# Altium footprint library EPCOS.PcbLib: 178 footprints (part 11 of 12)
Each footprint in its own frame and in the unit in brackets; x right, y up, seen from the top. Pads: shape width x height; smd on the part's side, far side on the other; paste and mask are expansions set on the pad; w line width, h text height; cw(c..) or ccw(c..) is an arc to the next point about the centre after c.
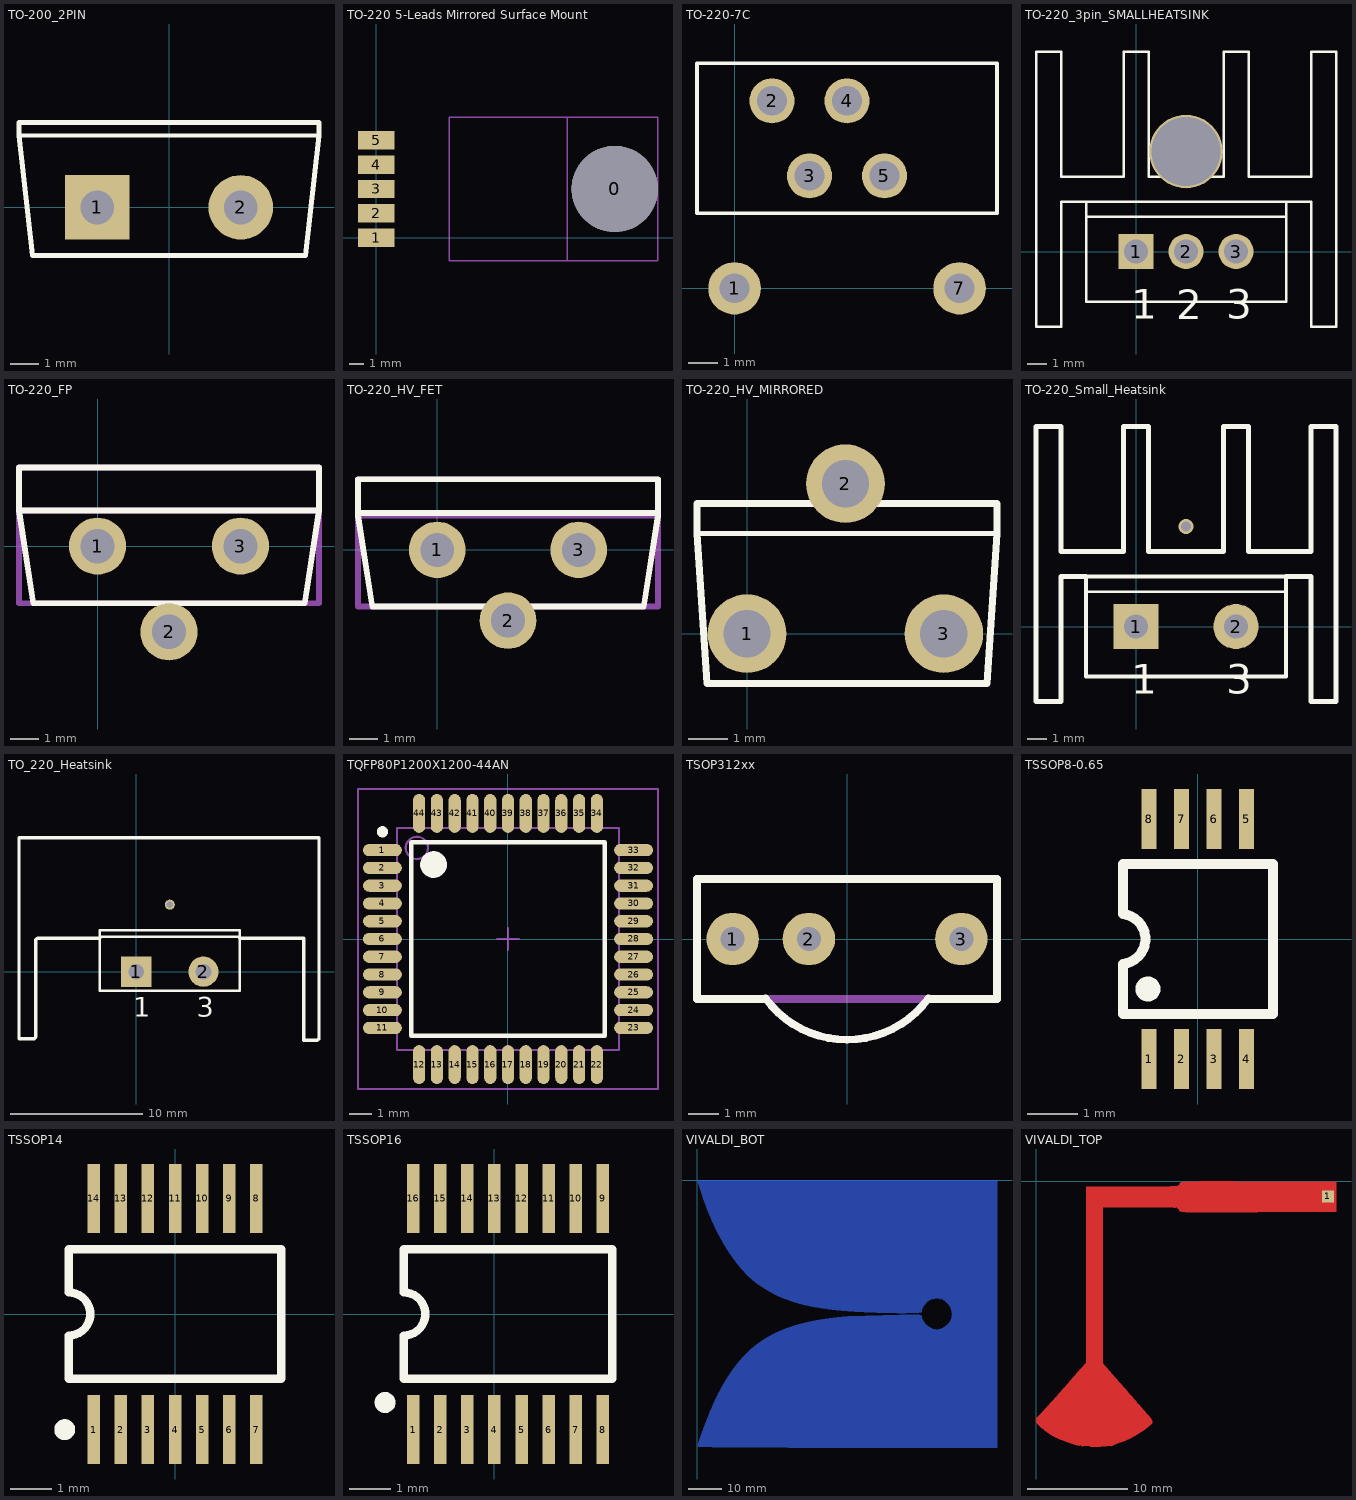
[diagram p10: the footprints below, top view; thin cyan lines are the x and y axes]

## TO-200_2PIN [mil]
height 790
pads (2):
  rect 90x90 hole 47.24: 1(-100,0)
  round 90 hole 47.24: 2(100,0)
Top Overlay:
  lines w5: -209.02,100 208.98,100
  lines w7: -209.02,100 -209.02,118 209.02,118 209.02,100 190,-67 -190,-67 -209.02,100
3D body "User Library-TO220-2_V-S.STEP": height 787.4, standoff -86.61, extent -196.85,-71.47 196.85,105.7

## TO-220 5-Leads Mirrored Surface Mount [mil]
height 181
pads (6):
  round 236 hole 236.22 unplated: 0(653,133.33)
  rect 100x50 smd: 1(0,0) 2(0,66.67) 3(0,133.33) 4(0,200) 5(0,266.67)
Mechanical 13:
  lines w4: 523,-63.7 771,-63.7 771,330.3 523,330.3 ; 523,-63.7 200,-63.7 200,330.3 523,330.3 ; 523,-63.7 523,330.3
3D body: height 181, standoff 130, extent 523.02,-63.68 770.98,330.28
3D body: height 181, standoff 0, extent 200.02,-63.68 522.98,330.28

## TO-220-7C [mil]
height 787
pads (6):
  round 70 hole 39.37: 1(0,0) 7(300,0)
  round 60 hole 39.37: 2(50,250) 3(100,150) 4(150,250) 5(200,150)
Top Overlay:
  lines w5: -50,100 350,100 350,300 -50,300 -50,100

## TO-220_3pin_SMALLHEATSINK [mil]
height 980
pads (4):
  rect 70x70 hole 47.24: 1(0,0)
  round 70 hole 47.24: 2(100,0) 3(200,0)
  round 147 hole 137.8: ""(100,200)
Top Overlay:
  lines w5: -100,70 300,70 ; -100,100 -150,100 -150,-150 -200,-150 -200,400 -150,400 -150,150 -25,150 -25,400 25,400 25,150 175,150 175,400 225,400 225,150 350,150 350,400 400,400 400,-150 350,-150 350,100 300,100 ; -100,100 300,100 ; -100,100 -100,-100 300,-100 300,100
  text "1" at -9.84,-134.84 h59.06
  text "3" at 180.31,-134.84 h59.06
  text "2" at 80,-135 h59.06
3D body: height 980, standoff 0, extent -199.98,-149.98 399.98,399.98

## TO-220_FP [mm]
height 20
pads (3):
  round 2 hole 1.2: 1(0,0) 2(2.5,-3) 3(5,0)
Top Overlay:
  lines w0.2: -2.75,1.25 -2.25,-2 7.25,-2 7.75,1.25 ; -2.75,1.25 -2.75,2.75 7.75,2.75 7.75,1.25 ; -2.75,1.25 7.75,1.25
Mechanical 13:
  lines w0.2: -2.75,1.2 -2.75,2.75 7.75,2.75 7.75,1.2 ; -2.75,-2 -2.75,1.25 7.75,1.25 7.75,-2 -2.75,-2
3D body: height 13.5, standoff 5, extent -2.75,-2 7.75,1.25
3D body: height 20, standoff 5, extent -2.75,1.25 7.75,2.75

## TO-220_HV_FET [mm]
height 20.066
pads (3):
  round 2 hole 1.2: 1(0,0) 2(2.5,-2.5) 3(5,0)
Top Overlay:
  lines w0.2: -2.8,1.3 7.8,1.3 ; -2.8,1.2 -2.8,2.5 7.8,2.5 7.8,1.2 7.3,-2 -2.3,-2 -2.8,1.2
Mechanical 13:
  lines w0.2: -2.8,1.2 -2.8,-2 7.4,-2 7.8,-2 7.8,1.2 ; -2.8,1.2 -2.8,2.5 7.8,2.5 7.8,1.2 ; -2.8,1.2 7.8,1.2
3D body "User Library-TO-220AB-V.STEP": height 21.86, standoff -2, extent -2.835,-2.8 7.835,2.67

## TO-220_HV_MIRRORED [mm]
height 5.08
pads (3):
  round 2 hole 1.2: 1(0,0) 2(2.5,3.81) 3(5,0)
Top Overlay:
  lines w0.127: -1.27,2.54 6.35,2.54
  lines w0.178: -1.27,2.54 -1.27,3.302 6.35,3.302 6.35,2.54 6.096,-1.27 -1.016,-1.27 -1.27,2.54

## TO-220_Small_Heatsink [mil]
height 980
pads (3):
  rect 90x90 hole 47.24: 1(0,0)
  round 90 hole 47.24: 2(200,0)
  round 30 hole 20: ""(100,200)
Top Overlay:
  lines w5: -100,70 300,70
  lines w7.87: -100,-100 -100,100 300,100 300,-100 -100,-100
  lines w10: -100,100 -150,100 -150,-150 -200,-150 -200,400 -150,400 -150,150 -25,150 -25,400 25,400 25,150 175,150 175,400 225,400 225,150 350,150 350,400 400,400 400,-150 350,-150 350,100 300,100
  text "3" at 180.31,-134.84 h59.06
  text "1" at -9.84,-134.84 h59.06

## TO_220_Heatsink [mil]
pads (3):
  rect 90x90 hole 47.24: 1(0,0)
  round 90 hole 47.24: 2(200,0)
  round 30 hole 20: ""(100,200)
Top Overlay:
  lines w7.87: -108.66,104.33 308.66,104.33 ; -108.66,-57.09 308.66,-57.09 308.66,124.02 -108.66,124.02 -108.66,-57.09
  lines w10: -108.66,100 -295,100 -300,95 -300,-195 -305,-200 -350,-200 -350,400 545,400 545,-200 540,-205 500,-205 500,-91.34 500,100 308.66,100
  text "1" at -9.84,-134.84 h59.06
  text "3" at 180.31,-134.84 h59.06

## TQFP80P1200X1200-44AN [mm] "Thin QFP, 44-Leads, Body 10x10mm, Pitch 0.8mm, IPC Medium Density"
height 1.2
pads (44):
  oval 1.75x0.55 smd: 1(-5.65,4) 2(-5.65,3.2) 3(-5.65,2.4) 4(-5.65,1.6) 5(-5.65,0.8) 6(-5.65,0) 7(-5.65,-0.8) 8(-5.65,-1.6) 9(-5.65,-2.4) 10(-5.65,-3.2) 11(-5.65,-4) 23(5.65,-4) 24(5.65,-3.2) 25(5.65,-2.4) 26(5.65,-1.6) 27(5.65,-0.8) 28(5.65,0) 29(5.65,0.8) 30(5.65,1.6) 31(5.65,2.4) 32(5.65,3.2) 33(5.65,4)
  oval 0.55x1.75 smd: 12(-4,-5.65) 13(-3.2,-5.65) 14(-2.4,-5.65) 15(-1.6,-5.65) 16(-0.8,-5.65) 17(0,-5.65) 18(0.8,-5.65) 19(1.6,-5.65) 20(2.4,-5.65) 21(3.2,-5.65) 22(4,-5.65) 34(4,5.65) 35(3.2,5.65) 36(2.4,5.65) 37(1.6,5.65) 38(0.8,5.65) 39(0,5.65) 40(-0.8,5.65) 41(-1.6,5.65) 42(-2.4,5.65) 43(-3.2,5.65) 44(-4,5.65)
Top Overlay:
  circle w0.25: c-5.65,4.825 r0.125
  circle w0.6: c-3.35,3.35 r0.3
  lines w0.2: -4.35,-4.35 -4.35,4.35 4.35,4.35 4.35,-4.35 -4.35,-4.35
Mechanical 13:
  circle w0.1: c-4.1,4.1 r0.5
  lines w0.1: -5,-5 -5,5 5,5 5,-5 -5,-5
Mechanical 15:
  lines w0.1: -0.5,0 0.5,0 ; 0,-0.5 0,0.5 ; -6.75,-6.75 -6.75,6.75 6.75,6.75 6.75,-6.75 -6.75,-6.75
3D body "User Library-TQFP44-4.step": height 1.15, standoff 0, extent -6.012,-6.012 6.012,6.012

## TSOP312xx [mm]
height 12.5
pads (3):
  round 1.75 hole 0.8: 1(-3.81,0) 2(-1.27,0) 3(3.81,0)
Top Overlay:
  lines w0.254: -2.75,-2 -5,-2 -5,2 5,2 5,-2 2.75,-2 ; -2.716,-1.976 ccw(c0,0) 2.716,-1.976
Mechanical 13:
  lines w0.254: -2.7,-1.998 ccw(c0,0) 2.7,-1.998 ; -5,-2 -5,2 5,2 5,-2 -5,-2
3D body "User Library-User Library-tsop312.step": height 13.5, standoff -1, extent -5,-3.8 5,2

## TSSOP8-0.65 [mm]
height 1.1
pads (8):
  rect 0.3x1.2 smd: 1(-0.975,-2.4) 2(-0.325,-2.4) 3(0.325,-2.4) 4(0.975,-2.4) 5(0.975,2.4) 6(0.325,2.4) 7(-0.325,2.4) 8(-0.975,2.4)
Top Overlay:
  circle w0.25: c-1,-1 r0.125
  lines w0.2: -1.5,-0.517 -1.5,-1.5 1.5,-1.5 1.5,1.5 -1.5,1.5 -1.5,0.517 ; -1.5,-0.498 ccw(c-1.55,0) -1.5,0.498
3D body "User Library-TSSOP-8 3_1x3_1.STEP": height 1.1, standoff 0, extent -1.55,-2.5 1.55,2.5

## TSSOP14 [mm] "Shrink Small Outline, Plastic, Thin; 14 Leads; Body Width 4.4 mm; Pitch 0.65 mm"
height 1.1
pads (14):
  rect 0.3x1.65 smd: 1(-1.95,-2.775) 2(-1.3,-2.775) 3(-0.65,-2.775) 4(0,-2.775) 5(0.65,-2.775) 6(1.3,-2.775) 7(1.95,-2.775) 8(1.95,2.775) 9(1.3,2.775) 10(0.65,2.775) 11(0,2.775) 12(-0.65,2.775) 13(-1.3,2.775) 14(-1.95,2.775)
Top Overlay:
  circle w0.25: c-2.65,-2.775 r0.125
  lines w0.2: -2.55,-1.55 -2.55,-0.517 ccw(c-2.55,0) -2.55,0.517 -2.55,1.55 2.55,1.55 2.55,-1.55 -2.55,-1.55
3D body "User Library-TSSOP14-1.step": height 1.1, standoff 0, extent -2.5,-3.2 2.5,3.2

## TSSOP16 [mm] "Shrink Small Outline, Plastic, Thin; 16 Leads; Body Width 4.4 mm; Pitch 0.65 mm"
height 1.1
pads (16):
  rect 0.3x1.65 smd: 1(-1.95,-2.775) 2(-1.3,-2.775) 3(-0.65,-2.775) 4(0,-2.775) 5(0.65,-2.775) 6(1.3,-2.775) 7(1.95,-2.775) 8(2.6,-2.775) 9(2.6,2.775) 10(1.95,2.775) 11(1.3,2.775) 12(0.65,2.775) 13(0,2.775) 14(-0.65,2.775) 15(-1.3,2.775) 16(-1.95,2.775)
Top Overlay:
  circle w0.25: c-2.625,-2.125 r0.125
  lines w0.2: -2.175,0.517 cw(c-2.175,0) -2.175,-0.517 -2.175,-1.55 2.825,-1.55 2.825,1.55 -2.175,1.55 -2.175,0.525
3D body "User Library-TSSOP-16-2.STEP": height 1.2, standoff 0, extent -2.175,-3.2 2.825,3.2

## VIVALDI_BOT [mm]
Bottom Layer:
  drawing of 1 lines, arcs and shapes, not listed

## VIVALDI_TOP [mm]
pads (1):
  rect 1.2x1.2 smd: 1(29.1,-1.5)
Top Layer:
  region: 764 vertices and 0 holes, not listed, extent -0.02,-26.441 29.901,0